# Altium schematic symbol library Sang_library.SchLib: 1607 symbols (part 9 of 15) (continued)
## MC33151
designator U?
High Speed Dual MOSFET Driver; Published: 17-Jul-2002; LatestRevisionDate: 13-Apr-2006; LatestRevisionNote: IPC-7351 Footprint Added.; DatasheetVersion: Apr-2000; PackageVersion: Sep-1999; PackageReference: 751-06; Publisher: Altium Limited; PackageDescription: 8-Pin Small Outline Integrated Circuit 1.27 mm Pitch; Code_JEDEC: MS-012-AA; Code_IPC: SOIC127P600-8; ComponentLink1Description: Manufacturer Link; ComponentLink1URL: http://www.onsemi.com/site/products/parametrics/0,4446,388,00.html; ComponentLink2Description: Datasheet; ComponentLink2URL: http://www.onsemi.com/pub/Collateral/MC34151-D.PDF
footprint DIP8 (DIP, 8-Leads, Row Spacing 7.62mm, Pitch 2.54mm, Body 9.91x6.73mm)
footprint SO8 (SOIC, 8-Leads, Body 4.9x3.9mm, Pitch 1.27mm, IPC High Density)
pins: 1 NC, 2 INA (in), 3 GND (power), 4 INB (in), 5 ~{OUTB} (out), 6 VCC (power), 7 ~{OUTA} (out), 8 NC
text: A; B

## MC33932
designator U?, comment 5A H-Brigde
footprint HSOP44 (HSOP, 44-Leads, Body 16.00x11.00mm, Pitch 0.65mm, IPC High Density)
pins: 1 D1, 2 FBA, 3 EN/~{D2}, 4 V-POW-A, 5 V-POW-A, 6 V-POW-A, 7 OUT1, 8 OUT1, 9 OUT1, 10 V-GND-A, 11 V-GND-A, 12 V-GND-B, 13 V-GND-B, 14 OUT4, 15 OUT4, 16 OUT4, 17 V-PWRB, 18 V-PWRB, 19 CCPB, 20 IN4, 21 IN3, 22 ~{SFB}, 23 D3, 24 FBB, 25 EN/~{D4}, 26 V-PWRB, 27 V-PWRB, 28 V-PWRB, 29 OUT3, 30 OUT3, 31 OUT3, 32 V-GND-B, 33 V-GND-B, 34 V-GND-A, 35 V-GND-A, 36 OUT2, 37 OUT2, 38 OUT2, 39 V-POW-A, 40 V-POW-A, 41 CCPA, 42 IN2, 43 IN1, 44 ~{SFA}

## MC34063AD
designator IC?
DC-to-DC Converter Control Circuit; Published: 15-Apr-2002; LatestRevisionDate: 13-Apr-2006; LatestRevisionNote: IPC-7351 Footprint Added.; DatasheetVersion: 1996; PackageVersion: 1998; PackageReference: 751-05; Publisher: Altium Limited; PackageDescription: 8-Pin Small Outline Integrated Circuit 1.27 mm Pitch; Code_JEDEC: MS-012-AA; Code_IPC: SOIC127P600-8; ComponentLink1Description: Manufacturer Link; ComponentLink1URL: http://www.onsemi.com/site/products/taxonomy/0,4438,503,00.html; ComponentLink2Description: Datasheet; ComponentLink2URL: http://www.onsemi.com/pub/Collateral/MC34063A-D.PDF
footprint SO8
footprint DIP8
pins: 1 SWC, 2 SWE, 3 TCAP, 4 GND (power), 5 IN- (in), 6 VCC (power), 7 IPK, 8 IDC (oc)

## MC145026
designator IC?
Encoder Remote; Value: MC145026
footprint DIP16
pins: 1 A1 (in), 2 A2 (in), 3 A3 (in), 4 A4 (in), 5 A5 (in), 6 A6/D6 (in), 7 A7/D7 (in), 8 GND (power), 9 A8/D8 (in), 10 A9/D9 (in), 11 RS, 12 CTC, 13 RTC, 14 ~{TE} (in), 15 DO (out), 16 VDD (power)

## MC145027
designator IC?, comment MC145017
Decoder Remote; Value: MC145027
footprint DIP16
pins: 1 A1 (in), 2 A2 (in), 3 A3 (in), 4 A4 (in), 5 A5 (in), 6 R1, 7 C1, 8 GND (power), 9 DI (in), 10 R2/C2, 11 VT (out), 12 D9 (out), 13 D8 (out), 14 D7 (out), 15 D6 (out), 16 VDD (power)

## MC 43063
designator MC?, comment MC 34063
Dán; Ghi_Chu: *; Kieu_Chan: *; Don_Vi: *; Ma_Hang: *; Chung_Loai: *; Ten_Linh_Kien: *
footprint SO-8 (8-Pin Small Outline Integrated Circuit 1.27 mm Pitch, IPC Medium Density)
pins: 1 SWC, 2 SWE, 3 TC, 4 GND, 5 CII, 6 VCC, 7 IPK, 8 DRC

## MC 43063_1
designator MC?, comment MC 34063
Dán; Ghi_Chu: *; Kieu_Chan: *; Don_Vi: *; Ma_Hang: *; Chung_Loai: *; Ten_Linh_Kien: *
footprint SO-8 (8-Pin Small Outline Integrated Circuit 1.27 mm Pitch, IPC Medium Density)
pins: 1 SWC, 2 SWE, 3 TC, 4 GND, 5 CII, 6 VCC, 7 IPK, 8 DRC

## MCP42xxx
designator MCP42xxx?
footprint SO14 (SOIC, 14-Leads, Body 8.60x3.90mm, Pitch 1.27mm, IPC Medium Density)
pins: 1 CS, 2 SCK, 3 SI, 4 GND, 5 PB1, 6 PW1, 7 PA1, 8 PA0, 9 PW0, 10 PB0, 11 RS, 12 SHDN, 13 SO, 14 VCC
text: P0; P1

## MCP1541
designator U?
IC VREF SERIES 1% SOT23-3; MPN: MCP1541T-I/TT; MFR: Microchip Technology; Solder: SMT; Value: MCP1541; Category: IC; PinCount: 3
footprint SOT23_3 (SOT23, 3-Leads, Body 2,90x2,30mm, Pitch 0,95mm, IPC Medium Density)
pins: 1 VIN (in), 2 VOUT (out), 3 GND

## MCP1541T
designator P?, comment 4.096V REF
footprint SOT233
pins: 1 IN, 2 OUT, 3 GND

## MCP3201
designator U?
12 BIT A/D CONVERTOR; Manufacturer Part Number: MCP3201-CI/SN; Manufacturer: Microchip Technology; Data Interface: Serial, SPI™; Number of Inputs and Type: 1 Single-Ended, Unipolar; Sampling Rate (Per Second): 100k; Number of Converters: 1; Number of Bits: 12; Voltage Supply Source: Single Supply; Supplier 1: Digi-Key; Supplier Part Number 1: MCP3201-CI/SN-ND; RoHS: RoHS Compliant; Power Dissipation (Max): -; Mounting Type: Surface Mount; Supplier: Digi-Key; Operating Temperature: -40°C ~ 85°C; Category: Integrated Circuits (ICs); Supplier Part Number: MCP3201-CI/SN-ND; Supplier Device Package: *; Packaging: Tube; Package / Case: 8-SOIC (3.9mm Width)
footprint SO8
footprint DIP8
pins: 1 VREF, 2, 3, 4 VSS, 5 ~{CS}, 6 DO, 7 CLK, 8 VCC

## MCP3550
designator U?
22 BIT A/D CONVERTOR; Manufacturer: Microchip Technology; Manufacturer Part Number: MCP3550-60E/SN; Voltage Supply Source: Single Supply; Number of Bits: 22; Sampling Rate (Per Second): 15; Number of Converters: 1; Data Interface: Serial, SPI™; Number of Inputs and Type: 1 Differential, Unipolar; Supplier 1: Digi-Key; Supplier Part Number 1: MCP3550-60E/SN-ND; Power Dissipation (Max): -; Supplier Part Number: MCP3550-60E/SN-ND; Packaging: Tube; Supplier Device Package: *; Supplier: Digi-Key; Operating Temperature: -40°C ~ 125°C; Package / Case: 8-SOIC (3.9mm Width); Mounting Type: Surface Mount; RoHS: RoHS Compliant
footprint SO8
footprint DIP8
pins: 1 VREF, 2, 3, 4 VSS, 5 CLK, 6 DO, 7 ~{CS}, 8 VCC

## MCP4725
designator U?
12 BIT DAC WITH I2C INTERFACE
footprint SOT23-6
footprint DIP6
pins: 1 OUT, 2 GND, 3 VCC, 4 SDA, 5 SCL, 6 A0

## MCR 100-6
designator *
pins: 1 K, 2 A, 3 G

## MCR 100-6_1
designator *
pins: 1 K, 2 A, 3 G

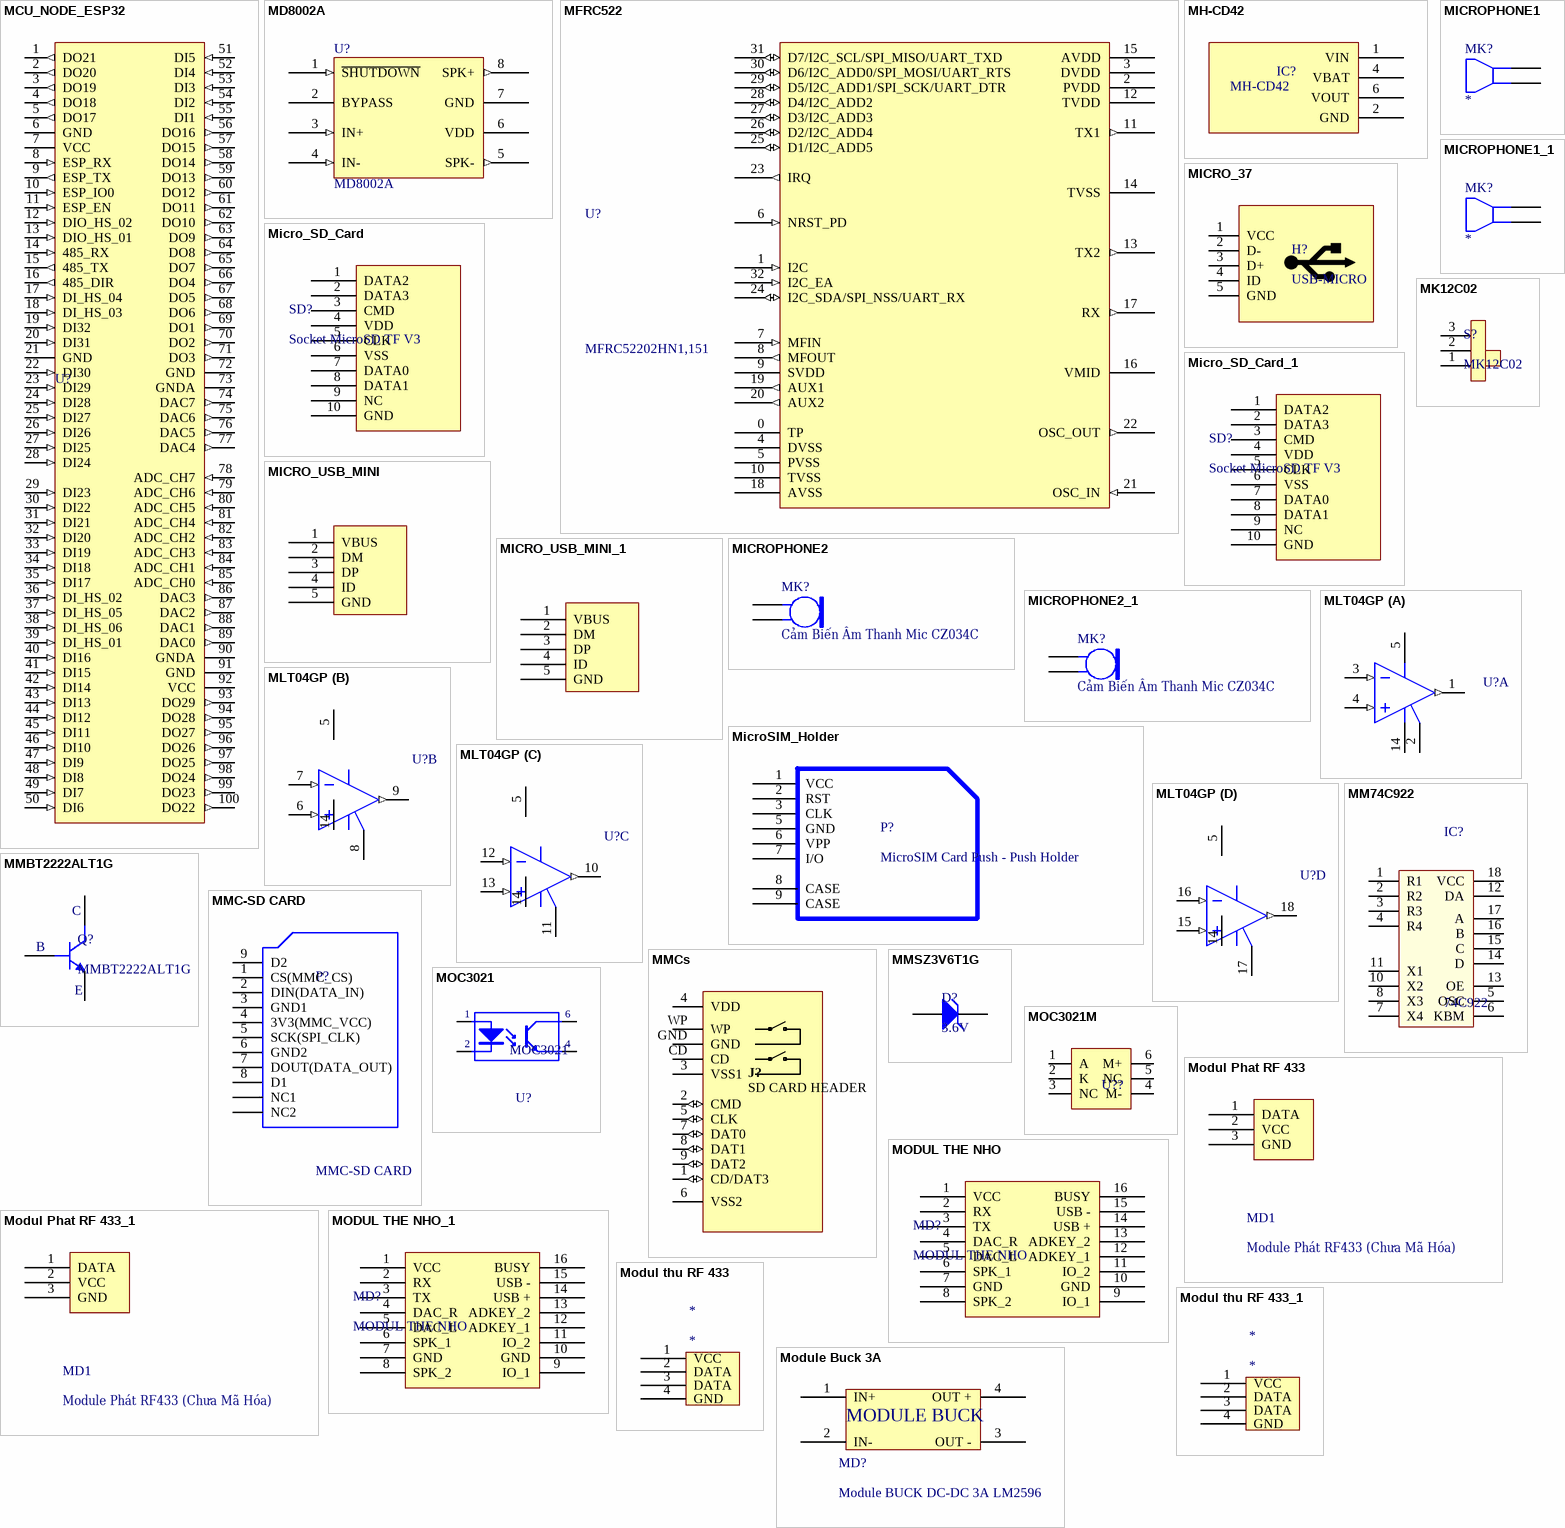
[diagram p55: symbols MCU_NODE_ESP32 to Module Buck 3A]

## MCU_NODE_ESP32
designator U?
MPN: MCU_NODE_ESP32; MFR: BY TECH; Solder: SMT; Category: IC
footprint ESP_NODE_MCU
pins: 1 DO21 (out), 2 DO20 (out), 3 DO19 (out), 4 DO18 (out), 5 DO17 (out), 6 GND, 7 VCC, 8 ESP_RX (in), 9 ESP_TX (out), 10 ESP_IO0 (in), 11 ESP_EN (in), 12 DIO_HS_02 (in), 13 DIO_HS_01 (in), 14 485_RX (in), 15 485_TX (out), 16 485_DIR (out), 17 DI_HS_04 (in), 18 DI_HS_03 (in), 19 DI32 (in), 20 DI31 (in), 21 GND, 22 DI30 (in), 23 DI29 (in), 24 DI28 (in), 25 DI27 (in), 26 DI26 (in), 27 DI25 (in), 28 DI24 (in), 29 DI23 (in), 30 DI22 (in), 31 DI21 (in), 32 DI20 (in), 33 DI19 (in), 34 DI18 (in), 35 DI17 (in), 36 DI_HS_02 (in), 37 DI_HS_05 (in), 38 DI_HS_06 (in), 39 DI_HS_01 (in), 40 DI16 (in), 41 DI15 (in), 42 DI14 (in), 43 DI13 (in), 44 DI12 (in), 45 DI11 (in), 46 DI10 (in), 47 DI9 (in), 48 DI8 (in), 49 DI7 (in), 50 DI6 (in), 51 DI5 (in), 52 DI4 (in), 53 DI3 (in), 54 DI2 (in), 55 DI1 (in), 56 DO16 (out), 57 DO15 (out), 58 DO14 (out), 59 DO13 (out), 60 DO12 (out), 61 DO11 (out), 62 DO10 (out), 63 DO9 (out), 64 DO8 (out), 65 DO7 (out), 66 DO4 (out), 67 DO5 (out), 68 DO6 (out), 69 DO1 (out), 70 DO2 (out), 71 DO3 (out), 72 GND, 73 GNDA, 74 DAC7 (out), 75 DAC6 (out), 76 DAC5 (out), 77 DAC4 (out), 78 ADC_CH7 (in), 79 ADC_CH6 (in), 80 ADC_CH5 (in), 81 ADC_CH4 (in), 82 ADC_CH2 (in), 83 ADC_CH3 (in), 84 ADC_CH1 (in), 85 ADC_CH0 (in), 86 DAC3 (out), 87 DAC2 (out), 88 DAC1 (out), 89 DAC0 (out), 90 GNDA, 91 GND, 92 VCC, 93 DO29 (out), 94 DO28 (out), 95 DO27 (out), 96 DO26 (out), 97 DO25 (out), 98 DO24 (out), 99 DO23 (out), 100 DO22 (out)

## MD8002A
designator U?
3W Audio Amplifier; Solder: SMT; MPN: MD8002A; Value: MD8002A; Category: IC; PinCount: 8
footprint SOIC-8
pins: 1 ~{SHUTDOWN} (in), 2 BYPASS (power), 3 IN+ (in), 4 IN- (in), 5 SPK- (out), 6 VDD (power), 7 GND (power), 8 SPK+ (out)

## MFRC522
designator U?, comment MFRC52202HN1,151
IC RFID READER 13.56MHZ 32HVQFN; MFR: NXP USA Inc.; Solder: SMT; MPN: MFRC52202HN1,151; Value: MFRC52202HN1,151; Category: IC; PinCount: 8
footprint VFQFN-32 (32-VFQFN Exposed Pad)
pins: 0 TP (power), 1 I2C (in), 2 PVDD (power), 3 DVDD (power), 4 DVSS (power), 5 PVSS (power), 6 NRST_PD (in), 7 MFIN (in), 8 MFOUT (out), 9 SVDD (power), 10 TVSS (power), 11 TX1 (out), 12 TVDD (power), 13 TX2 (out), 14 TVSS (power), 15 AVDD (power), 16 VMID (power), 17 RX (out), 18 AVSS (power), 19 AUX1 (out), 20 AUX2 (out), 21 OSC_IN (in), 22 OSC_OUT (out), 23 IRQ (out), 24 I2C_SDA/SPI_NSS/UART_RX (io), 25 D1/I2C_ADD5 (io), 26 D2/I2C_ADD4 (io), 27 D3/I2C_ADD3 (io), 28 D4/I2C_ADD2 (io), 29 D5/I2C_ADD1/SPI_SCK/UART_DTR (io), 30 D6/I2C_ADD0/SPI_MOSI/UART_RTS (io), 31 D7/I2C_SCL/SPI_MISO/UART_TXD (io), 32 I2C_EA (in)

## MH-CD42
designator IC?
footprint MH-CD42
pins: 1 VIN, 2 GND, 4 VBAT, 6 VOUT

## MICRO_37
designator H?, comment USB-MICRO
CONN RECEPT MINI USB R/A 5POS SMD; MPN: MICRO-37; Solder: WAVE; Value: USB-MICRO; MFR_URL: https://item.taobao.com/item.htm?id=575122934297&ali_refid=a3_430008_1006:1159190121:N:micro+usb+%E5%BA%A7:f3882559d872b66fa6d4c50709947fc8&ali_trackid=1_f3882559d872b66fa6d4c50709947fc8&spm=a230r.1.0.0
footprint MICRO-37
pins: 1 VCC, 2 D-, 3 D+, 4 ID, 5 GND

## Micro_SD_Card
designator SD?, comment Socket MicroSD TF V3
Dán; Ten_Linh_Kien: Socket MicroSD TF V3 ( Soket Thẻ Nhớ); Don_Vi: Con; Ma_Hang: MH001914; Ghi_Chu: *; Kieu_Chan: *; Chung_Loai: Dán
footprint MicroSD_TF_V1
footprint MicroSD_TF_V3
pins: 1 DATA2, 2 DATA3, 3 CMD, 4 VDD, 5 CLK, 6 VSS, 7 DATA0, 8 DATA1, 9 NC, 10 GND

## Micro_SD_Card_1
designator SD?, comment Socket MicroSD TF V3
Dán; Ten_Linh_Kien: Socket MicroSD TF V3 ( Soket Thẻ Nhớ); Don_Vi: Con; Ma_Hang: MH001914; Ghi_Chu: *; Kieu_Chan: *; Chung_Loai: Dán
footprint MicroSD_TF_V1
footprint MicroSD_TF_V3
pins: 1 DATA2, 2 DATA3, 3 CMD, 4 VDD, 5 CLK, 6 VSS, 7 DATA0, 8 DATA1, 9 NC, 10 GND

## MICRO_USB_MINI
designator MCR1
footprint Micro USB mini DIP
pins: 1 VBUS, 2 DM, 3 DP, 4 ID, 5 GND

## MICRO_USB_MINI_1
designator MCR1, comment MICRO_USB_MINI
footprint Micro USB mini DIP
pins: 1 VBUS, 2 DM, 3 DP, 4 ID, 5 GND

## MICROPHONE1
designator MK?
Microphone
pins: 1, 2

## MICROPHONE1_1
designator MK?
Microphone
pins: 1, 2

## MICROPHONE2
designator MK?, comment Cảm Biến Âm Thanh Mic CZ034C
Microphone; Ma_Hang: MH004597; Don_Vi: Con; Chung_Loai: Cắm; Kieu_Chan: *; Ten_Linh_Kien: Cảm Biến Âm Thanh Mic CZ034C; Ghi_Chu: *
pins: 1, 2

## MICROPHONE2_1
designator MK?, comment Cảm Biến Âm Thanh Mic CZ034C
Microphone; Ma_Hang: MH004597; Don_Vi: Con; Chung_Loai: Cắm; Kieu_Chan: *; Ten_Linh_Kien: Cảm Biến Âm Thanh Mic CZ034C; Ghi_Chu: *
pins: 1, 2

## MicroSIM_Holder
designator P?, comment MicroSIM Card Push - Push Holder
MFR_URL: Link mua hàng:  http://www.kme.com.vn/khay-micro-sim-y.html; CompanyID: VT-01312; Solder: SMT; Value: MicroSIM Card Push - Push Holder
footprint MicroSIM Card PUSH - PUSH HOLDER
pins: 1 VCC, 2 RST, 3 CLK, 5 GND, 6 VPP, 7 I/O, 8 CASE, 9 CASE

## MK12C02
designator S?
footprint MK12C02
pins: 1 + (power), 2 + (power), 3 + (power)

## MLT04GP
designator U?
Four-Channel, Four-Quadrant Analog Multiplier; Published: 8-Jun-2000; LatestRevisionDate: 04-Mar-2005; LatestRevisionNote: Stylized 3D Model Added.; DatasheetVersion: REV.B 1998; PackageReference: N-18; Publisher: Altium Limited; PackageDescription: DIP; 18 Leads; Row Spacing 7.62 mm; Pitch 2.54 mm; ComponentLink1Description: Manufacturer Link; ComponentLink1URL: http://www.analog.com/en/prod/0%2C2877%2CMLT04%2C00.html; ComponentLink2Description: Datasheet; ComponentLink2URL: http://www.analog.com/UploadedFiles/Data_Sheets/431190299mlt04.pdf
footprint DIP18 (DIP; 18 Leads; Row Spacing 7.62 mm; Pitch 2.54 mm)
pins on every part: 5 +V (power), 14 V- (power)
part A pins: 1 W (out), 2 GND (power), 3 X (in), 4 Y (in)
part B pins: 6 Y (in), 7 X (in), 8 GND (power), 9 W (out)
part C pins: 10 W (out), 11 GND (power), 12 X (in), 13 Y (in)
part D pins: 15 Y (in), 16 X (in), 17 GND (power), 18 W (out)

## MM74C922
designator IC?, comment 74C922
16 Key Encoder With Debouncer; Value: MM74C922
footprint DIP18 (DIP; 18 Leads; Row Spacing 7.62 mm; Pitch 2.54 mm)
pins: 1 R1, 2 R2, 3 R3, 4 R4, 5 OSC, 6 KBM, 7 X4, 8 X3, 9 GND hidden to GND, 10 X2, 11 X1, 12 DA, 13 OE, 14 D, 15 C, 16 B, 17 A, 18 VCC

## MMBT2222ALT1G
designator Q?
TRANS NPN 40V 0.6A SOT23; Solder: SMT; MPN: MMBT2222ALT1G; Value: MMBT2222ALT1G
footprint SOT23_3 (SOT23, 3-Leads, Body 2,90x2,30mm, Pitch 0,95mm, IPC Medium Density)
pins: 1 B, 2 E, 3 C

## MMC-SD CARD
designator P?
Header, 6-Pin; LatestRevisionDate: 17-Jul-2002; LatestRevisionNote: Re-released for DXP Platform.; Publisher: Altium Limited
footprint MMC
pins: 1 CS(MMC_CS), 2 DIN(DATA_IN), 3 GND1, 4 3V3(MMC_VCC), 5 SCK(SPI_CLK), 6 GND2, 7 DOUT(DATA_OUT), 8 D1, 9 D2, NC1, NC2
2 alternate drawings of the same symbol

## MMCs
designator J?, comment SD CARD HEADER
Secure Digital Card Socket; Max Current: mA; Connector type: Header; Mounting Technology: Surface Mount; Status: Production; Category: Connector
footprint mmc1 (SD Card socket)
pins: 1 CD/DAT3 (io), 2 CMD (io), 3 VSS1 (power), 4 VDD (power), 5 CLK (io), 6 VSS2 (power), 7 DAT0 (io), 8 DAT1 (io), 9 DAT2 (io), CD (oc), GND (power), WP (oc)

## MMSZ3V6T1G
designator D?, comment 3.6V
DIODE ZENER 3.6V 500MW SOD123; MPN: MMSZ3V6T1G; MFR: ON; Solder: SMT; Value: 3.6V
footprint SOD-123 (SOD123, 2-Leads, Body 2.6x1.6mm, Pitch 3.05mm, IPC High Density)
pins: 1 A, 2 K

## MOC3021
designator U?
Single Opto; Value: MOC3021
footprint DIP6
footprint SO6
pins: 1 A "Anode", 2 K "Cathode", 4 E "Emitter", 6 C "Collector"

## MOC3021M
designator U??  (value not drawn)
footprint DIP6
footprint SO6
pins: 1 A, 2 K, 3 NC, 4 M-, 5 NC, 6 M+

## Modul Phat RF 433
designator MD1, comment Module Phát RF433 (Chưa Mã Hóa)
Dán; Ma_Hang: MH000581; Don_Vi: Con; Ten_Linh_Kien: Module Phát RF433 (Chưa Mã Hóa); Ghi_Chu: *; Chung_Loai: Dán; Kieu_Chan: *
footprint Modul Phat RF 433
pins: 1 DATA, 2 VCC, 3 GND

## Modul Phat RF 433_1
designator MD1, comment Module Phát RF433 (Chưa Mã Hóa)
Dán; Ma_Hang: MH000581; Don_Vi: Con; Ten_Linh_Kien: Module Phát RF433 (Chưa Mã Hóa); Ghi_Chu: *; Chung_Loai: Dán; Kieu_Chan: *
footprint Modul Phat RF 433
pins: 1 DATA, 2 VCC, 3 GND

## MODUL THE NHO
designator MD?
footprint MODUL MP3
pins: 1 VCC, 2 RX, 3 TX, 4 DAC_R, 5 DAC_L, 6 SPK_1, 7 GND, 8 SPK_2, 9 IO_1, 10 GND, 11 IO_2, 12 ADKEY_1, 13 ADKEY_2, 14 USB +, 15 USB -, 16 BUSY

## MODUL THE NHO_1
designator MD?, comment MODUL THE NHO
footprint MODUL MP3
pins: 1 VCC, 2 RX, 3 TX, 4 DAC_R, 5 DAC_L, 6 SPK_1, 7 GND, 8 SPK_2, 9 IO_1, 10 GND, 11 IO_2, 12 ADKEY_1, 13 ADKEY_2, 14 USB +, 15 USB -, 16 BUSY

## Modul thu RF 433
designator *
pins: 1 VCC , 2 DATA, 3 DATA, 4 GND

## Modul thu RF 433_1
designator *
pins: 1 VCC , 2 DATA, 3 DATA, 4 GND

## Module Buck 3A
designator MD?, comment Module BUCK DC-DC 3A LM2596
Cắm; Ten_Linh_Kien: Module BUCK DC-DC 3A LM2596 ADJ; Don_Vi: Con; Ma_Hang: MH002392; Ghi_Chu: *; Kieu_Chan: *; Chung_Loai: Cắm
footprint Module Buck 3A
pins: 1 IN+, 2 IN-, 3 OUT -, 4 OUT +
text: MODULE BUCK

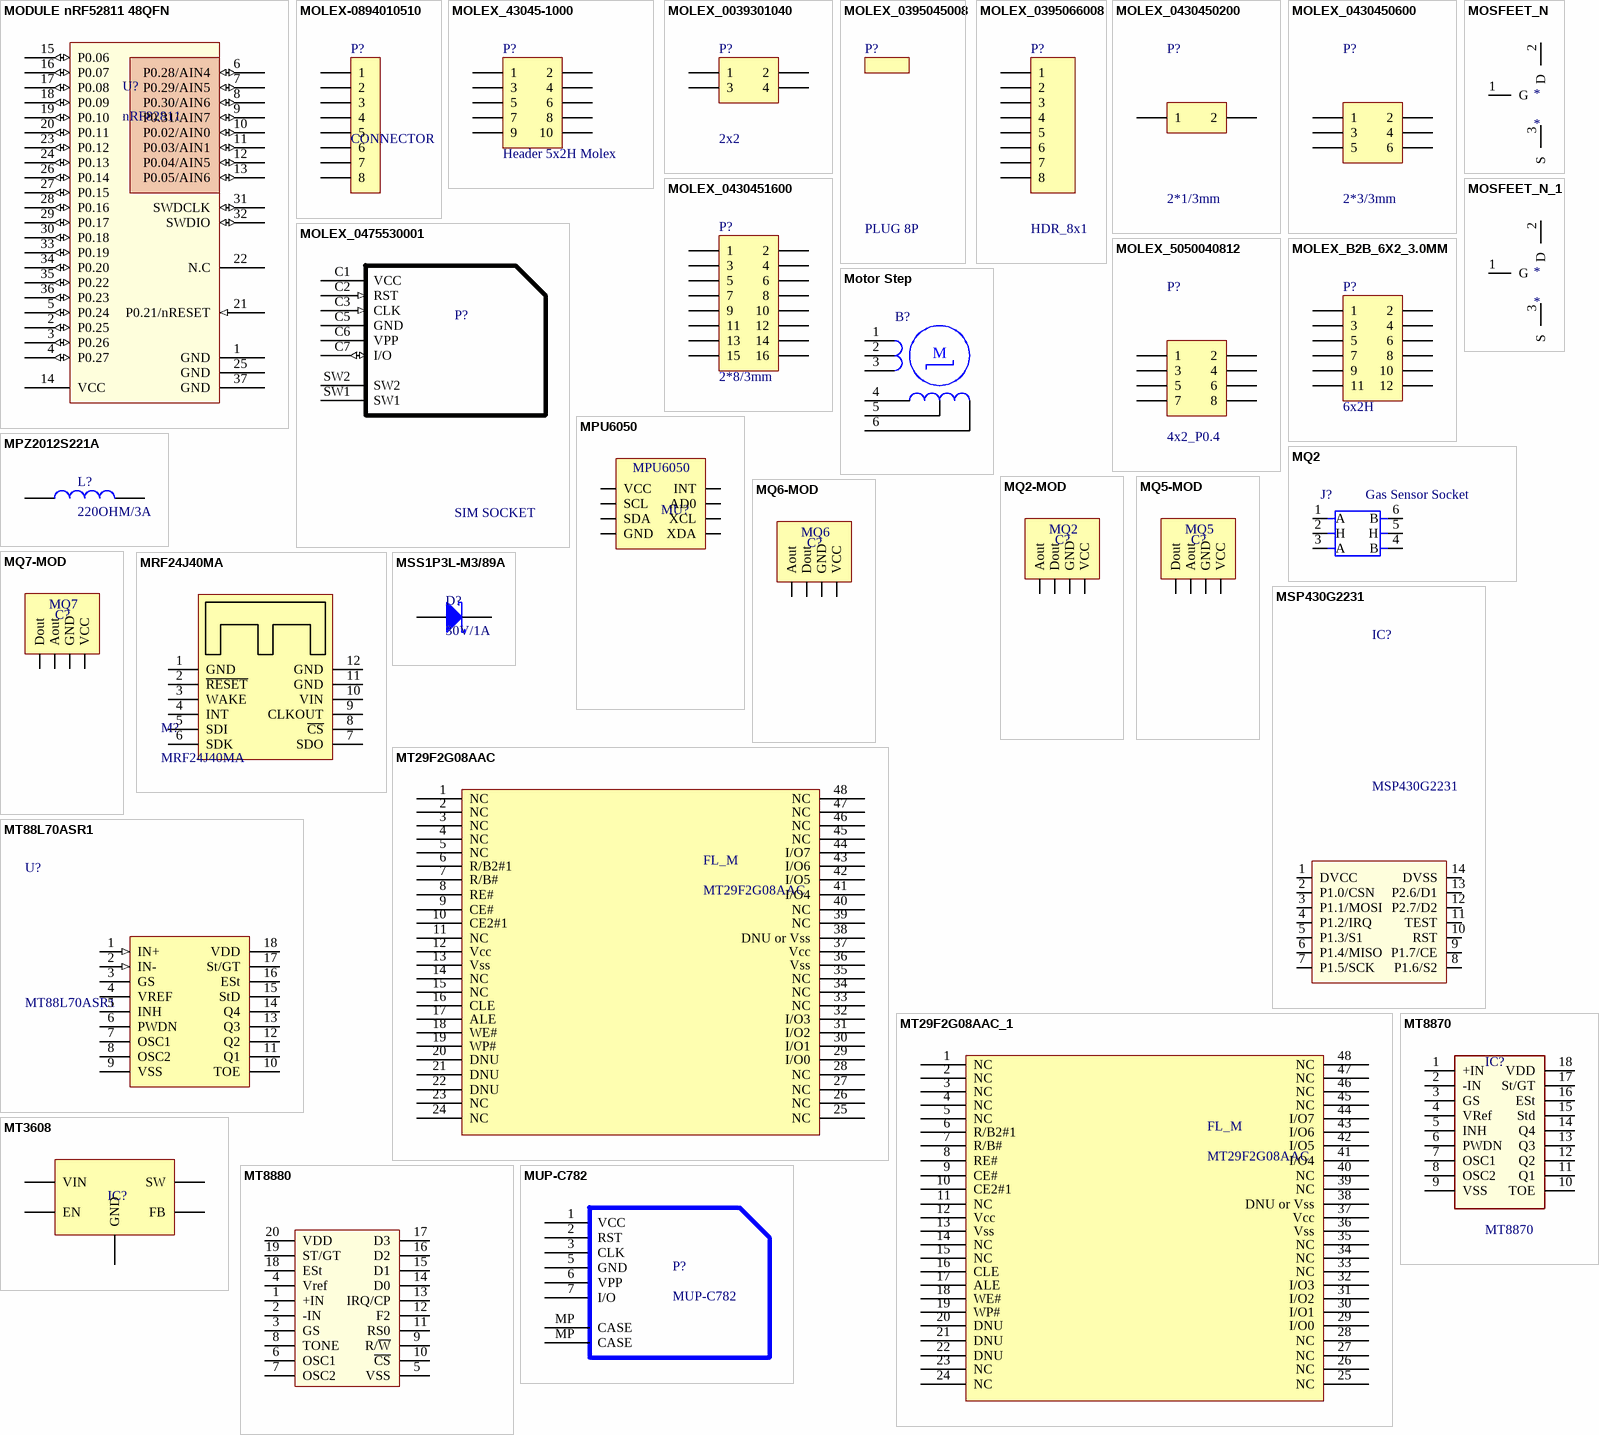
[diagram p56: symbols MODULE nRF52811 48QFN to MUP-C782]

## MODULE nRF52811 48QFN
designator U?, comment nRF82811
MPN: nRF52811 Module; Value: nRF82811
footprint BLE MODULE 52811
pins: 1 GND (power), 2 P0.25 (io), 3 P0.26 (io), 4 P0.27 (io), 5 P0.24 (io), 6 P0.28/AIN4 (io), 7 P0.29/AIN5 (io), 8 P0.30/AIN6 (io), 9 P0.31/AIN7 (io), 10 P0.02/AIN0 (io), 11 P0.03/AIN1 (io), 12 P0.04/AIN5 (io), 13 P0.05/AIN6 (io), 14 VCC (power), 15 P0.06 (io), 16 P0.07 (io), 17 P0.08 (io), 18 P0.09 (io), 19 P0.10 (io), 20 P0.11 (io), 21 P0.21/nRESET (in), 22 N.C, 23 P0.12 (io), 24 P0.13 (io), 25 GND (power), 26 P0.14 (io), 27 P0.15 (io), 28 P0.16 (io), 29 P0.17 (io), 30 P0.18 (io), 31 SWDCLK (io), 32 SWDIO (io), 33 P0.19 (io), 34 P0.20 (io), 35 P0.22 (io), 36 P0.23 (io), 37 GND (power)

## MOLEX-0894010510
designator P?, comment CONNECTOR
CONN HEADER R/A 5POS 2.0MM; MFR: Molex; MPN: 0894010510; Solder: WAVE
footprint MOLEX-0894010810 (Footprint not found)
pins: 1, 2, 3, 4, 5, 6, 7, 8

## MOLEX_43045-1000
designator P?, comment Header 5x2H Molex
Header, 5-Pin, Dual row, Right Angle, Pitch 3mm; MPN: 43045-1000; CompanyID: VT-01112; Solder: WAVE; Value: Header 5x2H Molex; MFR: MOLEX
footprint MOLEX_B2B_5X2_3.0MM
pins: 1, 2, 3, 4, 5, 6, 7, 8, 9, 10

## MOLEX_0039301040
designator P?, comment 2x2
CONN HEADER R/A 4POS 4.2MM; MFR: MOLEX; MPN: 0039301040; Solder: WAVE; Value: 0039301040
signal-integrity model Connector
footprint CON2X2ANGLE
pins: 1, 2, 3, 4

## MOLEX_0395045008
designator P?, comment PLUG 8P  (mechanical)
TERM BLOCK PLUG 8POS STR 3.5MM / (used with 0395066008); MFR: Molex; MPN: 0395045008; Solder: MAN

## MOLEX_0395066008
designator P?, comment HDR_8x1
TERM BLOCK HDR 8POS 90DEG 3.5MM; MFR: Molex; MPN: 0395066008; Solder: WAVE
footprint MOLEX_0395066008 (Footprint not found)
pins: 1, 2, 3, 4, 5, 6, 7, 8

## MOLEX_0430450200
designator P?, comment 2*1/3mm
CONN RECEPT 2POS 3mm DUAL ROW; MPN: 0430450200; Solder: WAVE; Value: 2*1/3mm
footprint HDR_1x2_3.0MM
pins: 1, 2

## MOLEX_0430450600
designator P?, comment 2*3/3mm
CONN RECEPT 6POS 3mm DUAL ROW; MPN: 0430450600; Solder: WAVE; Value: 2*3/3mm
footprint HDR_3x2_3.0MM
pins: 1, 2, 3, 4, 5, 6

## MOLEX_0430451600
designator P?, comment 2*8/3mm
CONN RECEPT 16POS 3mm DUAL ROW; MPN: 0430451600; Solder: WAVE; CompanyID: VT-00132; Value: 2*8/3mm
footprint HDR_8X2_3.0MM
pins: 1, 2, 3, 4, 5, 6, 7, 8, 9, 10, 11, 12, 13, 14, 15, 16

## MOLEX_0475530001
designator P?, comment SIM SOCKET
8 (6 + 2) Position Card CONN SIM/SAM CARD PUSH-PULL R/A; MPN: 0475530001; Solder: SMT; CompanyID: VT-01186; Value: SIM SOCKET
footprint 0475530001 (Footprint not found)
pins: C1 VCC (power), C2 RST (in), C3 CLK (in), C5 GND (power), C6 VPP, C7 I/O (io), SW1, SW2

## MOLEX_5050040812
designator P?, comment 4x2_P0.4
RECP ASSY B-B 0.4 8CKT TP; MPN: 5050040812; Solder: SMT; Value: 4x2_P0.4
footprint 5050040812 (Footprint not found)
pins: 1, 2, 3, 4, 5, 6, 7, 8

## MOLEX_B2B_6X2_3.0MM
designator P?, comment 6x2H
Header, 6-Pin, Dual row, Right Angle, Pitch 3mm; MPN: 43045-1200; CompanyID: VT-01113; Solder: HAND; Value: 6x2H
footprint MOLEX_B2B_6X2_3.0MM
pins: 1, 2, 3, 4, 5, 6, 7, 8, 9, 10, 11, 12

## MOSFEET_N
designator *
pins: 1 G, 2 D, 3 S

## MOSFEET_N_1
designator *
pins: 1 G, 2 D, 3 S

## Motor Step
designator B?
Motor Stepper; Published: 24-Mar-1999; LatestRevisionDate: 17-Jul-2002; LatestRevisionNote: Re-released for DXP Platform.; PackageReference: DIP-6; Publisher: Altium Limited; Code_JEDEC: MO-001-AM
footprint HDR6 (Connector; Header; 6 Position)
pins: 1 1A, 2, 3, 4, 5, 6
text: M

## MPU6050
designator MU?
Manufacturer: W¨¹rth Elektronik eiSos GmbH; partNo: 613004143121; ComponentLink1 Description: Manufacturer; ComponentLink2 Description: Datasheet; NoPins: 04; Created Date: 29 March 2013; ComponentLink1URL: http://www.we-online.com; ComponentLink2URL: http://katalog.we-online.de/em/datasheet/6130xx143121.pdf; Created by: Karrer Zheng
footprint MPU6050
pins: 1 VCC, 2 GND, 3 SCL, 4 SDA, 5 XDA, 6 XCL, 7 AD0, 8 INT

## MPZ2012S221A
designator L?, comment 220OHM/3A
IND-FERRITE BEAD 220 OHM 0805 1LN; MPN: MPZ2012S221A; CompanyID: VT-00253; Solder: SMT; Value: 220OHM/3A; Category: FERRITE BEAD; PinCount: 2
footprint IND-0805 (2012) (Resistor, Chip; 2.00 mm L X 1.25 mm W X 0.70 mm H body)
pins: 1, 2

## MQ2
designator J?, comment Gas Sensor Socket
footprint MQ2 (6P-D17.6X9.8H)
pins: 1 A, 2 H, 3 A, 4 B, 5 H, 6 B

## MQ2-MOD
designator C?
Manufacturer: W¨¹rth Elektronik eiSos GmbH; partNo: 613004143121; ComponentLink1 Description: Manufacturer; ComponentLink2 Description: Datasheet; NoPins: 04; Created Date: 29 March 2013; ComponentLink1URL: http://www.we-online.com; ComponentLink2URL: http://katalog.we-online.de/em/datasheet/6130xx143121.pdf; Created by: Karrer Zheng
footprint MQ2-MODULE
footprint JP4-C1T (4 row, straight, gold plating)
pins: 1 Aout, 2 Dout, 3 GND, 4 VCC
text: MQ2

## MQ5-MOD
designator C?
Manufacturer: W¨¹rth Elektronik eiSos GmbH; partNo: 613004143121; ComponentLink1 Description: Manufacturer; ComponentLink2 Description: Datasheet; NoPins: 04; Created Date: 29 March 2013; ComponentLink1URL: http://www.we-online.com; ComponentLink2URL: http://katalog.we-online.de/em/datasheet/6130xx143121.pdf; Created by: Karrer Zheng
footprint MQ5-MODULE
footprint JP4-C1T (4 row, straight, gold plating)
pins: 1 Dout, 2 Aout, 3 GND, 4 VCC
text: MQ5

## MQ6-MOD
designator C?
Manufacturer: W¨¹rth Elektronik eiSos GmbH; partNo: 613004143121; ComponentLink1 Description: Manufacturer; ComponentLink2 Description: Datasheet; NoPins: 04; Created Date: 29 March 2013; ComponentLink1URL: http://www.we-online.com; ComponentLink2URL: http://katalog.we-online.de/em/datasheet/6130xx143121.pdf; Created by: Karrer Zheng
footprint MQ6-MODULE
footprint JP4-C1T (4 row, straight, gold plating)
pins: 1 Aout, 2 Dout, 3 GND, 4 VCC
text: MQ6

## MQ7-MOD
designator C?
Manufacturer: W¨¹rth Elektronik eiSos GmbH; partNo: 613004143121; ComponentLink1 Description: Manufacturer; ComponentLink2 Description: Datasheet; NoPins: 04; Created Date: 29 March 2013; ComponentLink1URL: http://www.we-online.com; ComponentLink2URL: http://katalog.we-online.de/em/datasheet/6130xx143121.pdf; Created by: Karrer Zheng
footprint MQ6-MODULE
footprint JP4-C1T (4 row, straight, gold plating)
pins: 1 Dout, 2 Aout, 3 GND, 4 VCC
text: MQ7

## MRF24J40MA
designator M?
Microchip Zigbee Module
footprint MRF24J40MA (Microchip Zigbee Module)
pins: 1 GND, 2 ~{RESET}, 3 WAKE, 4 INT, 5 SDI, 6 SDK, 7 SDO, 8 ~{CS}, 9 CLKOUT, 10 VIN, 11 GND, 12 GND

## MSP430G2231
designator IC?
Value: 16F88; Value: DIP18
footprint DIP14
footprint TSSOP14 (TSSOP, 14-Leads, Body 5.00x4.40mm, Pitch 0.65mm, IPC High Density)
pins: 1 DVCC, 2 P1.0/CSN, 3 P1.1/MOSI, 4 P1.2/IRQ, 5 P1.3/S1, 6 P1.4/MISO, 7 P1.5/SCK, 8 P1.6/S2, 9 P1.7/CE, 10 RST, 11 TEST, 12 P2.7/D2, 13 P2.6/D1, 14 DVSS

## MSS1P3L-M3/89A
designator D?, comment 30V/1A
DIODE SCHOTTKY 30V 1A MICROSMP; MPN: MSS1P3L-M3/89A; Solder: SMT; CompanyID: VT-01279; Value: 30V/1A
pins: 1 A, 2 K

## MT29F2G08AAC
designator FL_M
pins: 1 NC, 2 NC, 3 NC, 4 NC, 5 NC, 6 R/B2#1, 7 R/B#, 8 RE#, 9 CE#, 10 CE2#1, 11 NC, 12 Vcc, 13 Vss, 14 NC, 15 NC, 16 CLE, 17 ALE, 18 WE#, 19 WP#, 20 DNU, 21 DNU, 22 DNU, 23 NC, 24 NC, 25 NC, 26 NC, 27 NC, 28 NC, 29 I/O0, 30 I/O1, 31 I/O2, 32 I/O3, 33 NC, 34 NC, 35 NC, 36 Vss, 37 Vcc, 38 DNU or Vss, 39 NC, 40 NC, 41 I/O4, 42 I/O5, 43 I/O6, 44 I/O7, 45 NC, 46 NC, 47 NC, 48 NC

## MT29F2G08AAC_1
designator FL_M, comment MT29F2G08AAC
pins: 1 NC, 2 NC, 3 NC, 4 NC, 5 NC, 6 R/B2#1, 7 R/B#, 8 RE#, 9 CE#, 10 CE2#1, 11 NC, 12 Vcc, 13 Vss, 14 NC, 15 NC, 16 CLE, 17 ALE, 18 WE#, 19 WP#, 20 DNU, 21 DNU, 22 DNU, 23 NC, 24 NC, 25 NC, 26 NC, 27 NC, 28 NC, 29 I/O0, 30 I/O1, 31 I/O2, 32 I/O3, 33 NC, 34 NC, 35 NC, 36 Vss, 37 Vcc, 38 DNU or Vss, 39 NC, 40 NC, 41 I/O4, 42 I/O5, 43 I/O6, 44 I/O7, 45 NC, 46 NC, 47 NC, 48 NC

## MT88L70ASR1
designator U?
IC TELECOM INTERFACE 18SOIC; MFR: Microchip Technology; Solder: SMT; MPN: MT88L70ASR1; Value: MT88L70ASR1; Category: IC; PinCount: 18
footprint SOIC-18 (SOIC, 18-Leads, Body 11.5x7.5mm, Pitch 1.27mm, IPC Low Density)
pins: 1 IN+ (in), 2 IN- (in), 3 GS, 4 VREF, 5 INH, 6 PWDN, 7 OSC1, 8 OSC2, 9 VSS, 10 TOE, 11 Q1, 12 Q2, 13 Q3, 14 Q4, 15 StD, 16 ESt, 17 St/GT, 18 VDD

## MT3608
designator IC?  (value not drawn)
footprint SOT23-6
pins: 1  SW, 2 GND, 3 FB, 4 EN, 5 VIN

## MT8870
designator IC?
DTMF RECEIVER IC MT8870 TESTER; Value: MT8068
footprint DIP18 (DIP; 18 Leads; Row Spacing 7.62 mm; Pitch 2.54 mm)
footprint SO18 (SOIC, 18-Leads, Body 11.6x7.5mm, Pitch 1.27mm, IPC High Density)
pins: 1 +IN, 2 -IN, 3 GS, 4 VRef, 5 INH, 6 PWDN, 7 OSC1, 8 OSC2, 9 VSS, 10 TOE, 11 Q1, 12 Q2, 13 Q3, 14 Q4, 15 Std, 16 ESt, 17 St/GT, 18 VDD

## MT8880
designator IC?, comment MT8880C
Integrated DTMF Transceiver; Value: DIP20; Value: MT8880C
footprint DIP20 (DIP 20, 20 PIN, W 300mil, Pin to pin 100mil)
footprint SO20 (SOIC, 20-Leads, Body 12.60x7.50mm, Pitch 1.27mm, IPC Medium Density)
pins: 1 +IN, 2 -IN, 3 GS, 4 Vref, 5 VSS, 6 OSC1, 7 OSC2, 8 TONE, 9 R/~{W}, 10 ~{CS}, 11 RS0, 12 F2, 13 IRQ/CP, 14 D0, 15 D1, 16 D2, 17 D3, 18 ESt, 19 ST/GT, 20 VDD

## MUP-C782
designator P?
MicroSIM Card Push - Push Holder; MFR: MUP; MPN: C782; Solder: SMT; Value: MUP-C782
footprint MUP-C782
pins: 1 VCC, 2 RST, 3 CLK, 5 GND, 6 VPP, 7 I/O, MP CASE, MP CASE

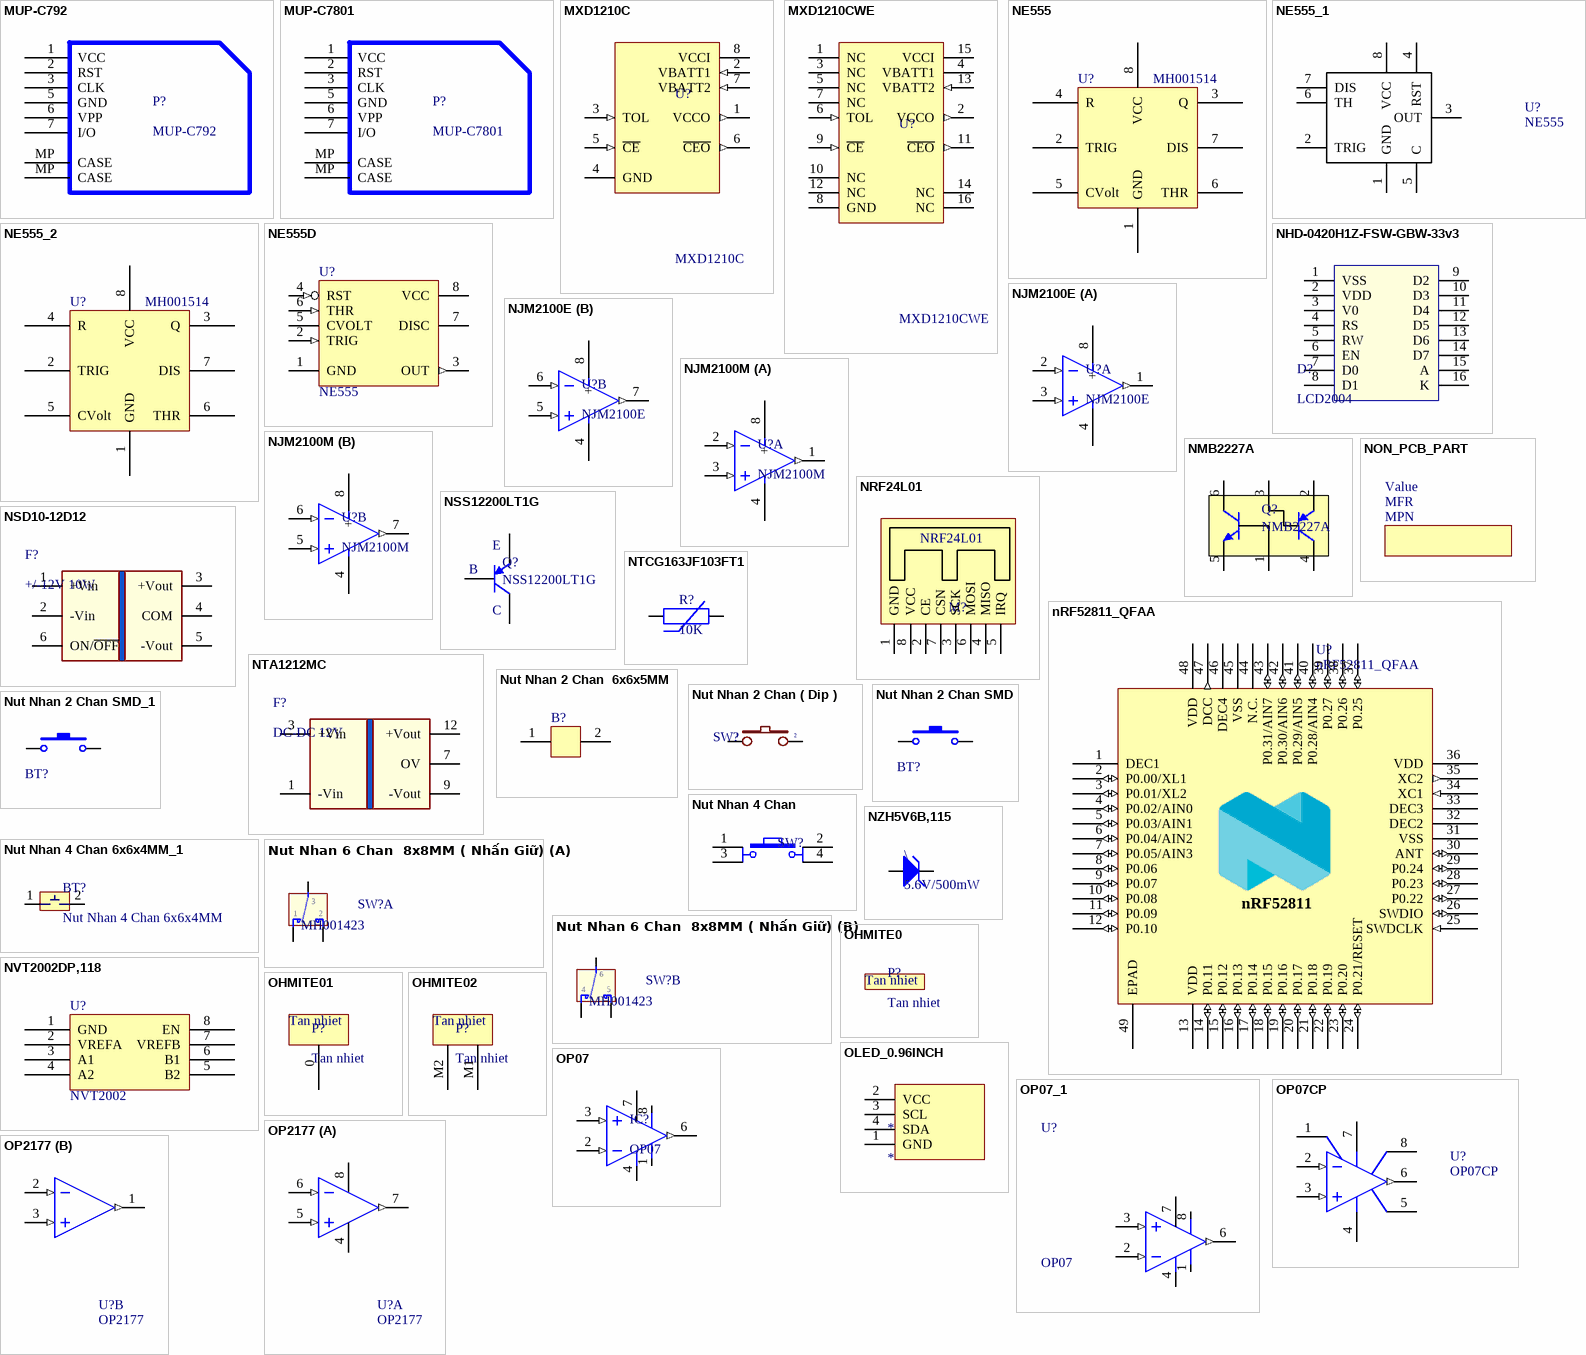
[diagram p57: symbols MUP-C792 to OP2177]

## MUP-C792
designator P?
MicroSIM Card Push - Push Holder; MFR: MUP; MPN: C792; Solder: SMT; Value: MUP-C792
footprint MUP-C792 (MicroSIM Card PUSH - PUSH HOLDER)
pins: 1 VCC, 2 RST, 3 CLK, 5 GND, 6 VPP, 7 I/O, MP CASE, MP CASE

## MUP-C7801
designator P?
NanoSIM Card Push - Push Holder; MFR: MUP; MPN: C7801; Solder: SMT; Value: MUP-C7801
footprint MUP-C7801
pins: 1 VCC, 2 RST, 3 CLK, 5 GND, 6 VPP, 7 I/O, MP CASE, MP CASE

## MXD1210C
designator U?
Nonvolatile RAM Controller; Published: 16-Jan-2001; LatestRevisionDate: 29-May-2009; LatestRevisionNote: Component Body Added.; DatasheetVersion: Mar-1996; PackageVersion: RevB, 21-0043; PackageReference: PA8; Publisher: Altium Limited; PackageDescription: DIP, 8-Pin, Row Spacing 7.62 mm, Pitch 2.54 mm; Code_JEDEC: MS-001-AB; ComponentLink1Description: Manufacturer Link; ComponentLink1URL: http://www.maxim-ic.com/; ComponentLink2Description: Datasheet; ComponentLink2URL: http://pdfserv.maxim-ic.com/en/ds/MXD1210.pdf
footprint DIP8
footprint SO8 (SOIC, 8-Leads, Body 4.9x3.9mm, Pitch 1.27mm, IPC High Density)
pins: 1 VCCO (out), 2 VBATT1 (in), 3 TOL (in), 4 GND (power), 5 ~{CE} (in), 6 ~{CEO} (out), 7 VBATT2 (in), 8 VCCI (power)

## MXD1210CWE
designator U?
Nonvolatile RAM Controller; Published: 16-Jan-2001; LatestRevisionDate: 13-Apr-2006; LatestRevisionNote: IPC-7351 Footprint Added.; DatasheetVersion: Mar-1996; PackageReference: WSO16; Publisher: Altium Limited; PackageDescription: 16-Pin Small Outline Integrated Circuit 1.27 mm Pitch; Code_JEDEC: MS-013-AA; Code_IPC: SOIC127P1030-16; ComponentLink1Description: Manufacturer Link; ComponentLink1URL: http://www.maxim-ic.com/; ComponentLink2Description: Datasheet; ComponentLink2URL: http://pdfserv.maxim-ic.com/en/ds/MXD1210.pdf
footprint SO16L (SOIC, 16-Leads, Body 10.30x7.50mm, Pitch 1.27mm, IPC Medium Density)
pins: 1 NC, 2 VCCO (out), 3 NC, 4 VBATT1 (power), 5 NC, 6 TOL (in), 7 NC, 8 GND (power), 9 ~{CE} (in), 10 NC, 11 ~{CEO} (out), 12 NC, 13 VBATT2 (in), 14 NC, 15 VCCI (power), 16 NC

## NE555
designator U?, comment MH001514
Dán; Value: NE555 SOP8
footprint sop 8
pins: 1 GND, 2 TRIG, 3 Q, 4 R, 5 CVolt, 6 THR, 7 DIS, 8 VCC

## NE555_1
designator U?, comment NE555
TIMER IC; Manufacturer Part Number: NE555DT; Manufacturer: STMicroelectronics; Frequency: 500kHz; Voltage - Supply: 4.5 V ~ 16 V; Current: 200mA; Supplier 1: Digi-Key; Supplier Part Number 1: 497-1962-2-ND; Supplier: Digi-Key; Category: Integrated Circuits (ICs); Supplier Part Number: 497-1962-2-ND; Package / Case: 8-SOIC (3.9mm Width); Packaging: Tape & Reel (TR); RoHS: RoHS Compliant; Operating Temperature: 0°C ~ 70°C; Count: -; Type: 555 Type, Timer/Oscillator (Single)
footprint SO8
footprint DIP8
pins: 1 GND, 2 TRIG, 3 OUT, 4 RST, 5 C, 6 TH, 7 DIS, 8 VCC

## NE555_2
designator U?, comment MH001514
Dán; Value: NE555 SOP8
footprint sop 8
pins: 1 GND, 2 TRIG, 3 Q, 4 R, 5 CVolt, 6 THR, 7 DIS, 8 VCC

## NE555D
designator U?, comment NE555
General-Purpose Single Bipolar Timer; MPN: LM555CMX/NOPB; Solder: SMT; Value: NE555; Category: IC
footprint SOIC8 (OPA2333)
pins: 1 GND (power), 2 TRIG (in), 3 OUT (out), 4 RST (in), 5 CVOLT, 6 THR (in), 7 DISC (oc), 8 VCC (power)

## NHD-0420H1Z-FSW-GBW-33v3
designator D?, comment LCD2004
footprint NHD-0420H1Z-FSW-GBW-33v3
pins: 1 VSS, 2 VDD, 3 V0, 4 RS, 5 RW, 6 EN, 7 D0, 8 D1, 9 D2, 10 D3, 11 D4, 12 D5, 13 D6, 14 D7, 15 A, 16 K

## NJM2100E
designator U?
DUAL OPERATIONAL AMPLIFIER; MFR: New Japan Radio; Solder: SMT; MPN: NJM2100E; Category: IC; Value: NJM2100E
footprint SOIC-8
part A pins: 1 OUT (out), 2 IN- (in), 3 IN+ (in), 4 VEE (power), 8 + (power)
part B pins: 4 VEE (power), 5 IN+ (in), 6 IN- (in), 7 OUT (out), 8 + (power)

## NJM2100M
designator U?
DUAL OPERATIONAL AMPLIFIER; MFR: New Japan Radio; Solder: SMT; MPN: NJM2100M; Category: IC; Value: NJM2100M
footprint DMP8 (TSOP, 8-Leads, Body 5.00x5.00mm, Pitch 1.27mm, IPC Medium Density)
part A pins: 1 OUT (out), 2 IN- (in), 3 IN+ (in), 4 VEE (power), 8 + (power)
part B pins: 4 VEE (power), 5 IN+ (in), 6 IN- (in), 7 OUT (out), 8 + (power)

## NMB2227A
designator Q?
TRANS PREBIAS NPN 250MW TO236AB; MFR: NXP Semiconductors; Solder: SMT; Value: NMB2227A; MPN: NMB2227A
pins: 1 B1, 2 E2, 3 B2, 4 C2, 5 E1, 6 C1

## NON_PCB_PART
designator M?, comment Value
Solder: *; Category: Misc; Value: Value; MPN: MPN; MFR: MFR

## NRF24L01
designator M?
footprint NRF24L01
footprint JP4-C2T (8 pins, dual row, straight, gold plating)
pins: 1 GND, 2 CE, 3 SCK, 4 MISO, 5 IRQ, 6 MOSI, 7 CSN, 8 VCC

## nRF52811_QFAA
designator U?
Multi-protocol Bluetooth Low Energy, ANT and 2.4GHz proprietary system-on-chip; MFR: Nordic Semiconductor; MPN: nRF52811_QFAA
footprint 48-VFQFN (VFQFN, 48-lead, Body 6x6 mm, 0.5 mm pitch,IPC High Density)
pins: 1 DEC1 (power), 2 P0.00/XL1 (io), 3 P0.01/XL2 (io), 4 P0.02/AIN0 (io), 5 P0.03/AIN1 (io), 6 P0.04/AIN2 (io), 7 P0.05/AIN3 (io), 8 P0.06 (io), 9 P0.07 (io), 10 P0.08 (io), 11 P0.09 (io), 12 P0.10 (io), 13 VDD (power), 14 P0.11 (io), 15 P0.12 (io), 16 P0.13 (io), 17 P0.14 (io), 18 P0.15 (io), 19 P0.16 (io), 20 P0.17 (io), 21 P0.18 (io), 22 P0.19 (io), 23 P0.20 (io), 24 P0.21/RESET (io), 25 SWDCLK (in), 26 SWDIO (io), 27 P0.22 (io), 28 P0.23 (io), 29 P0.24 (io), 30 ANT (io), 31 VSS (power), 32 DEC2 (power), 33 DEC3 (power), 34 XC1 (in), 35 XC2 (out), 36 VDD (power), 37 P0.25 (io), 38 P0.26 (io), 39 P0.27 (io), 40 P0.28/AIN4 (io), 41 P0.29/AIN5 (io), 42 P0.30/AIN6 (io), 43 P0.31/AIN7 (io), 44 N.C. (power), 45 VSS (power), 46 DEC4 (power), 47 DCC (out), 48 VDD (power), 49 (power) hidden to GND, 49 EPAD (power)
text: nRF52811

## NSD10-12D12
designator F?, comment +/-12V 10W
DC DC CONVERTER +/-12V 10W; MPN: NSD10-12D12; Solder: WAVE; Value: +/-12V 10W
footprint MW-NSD10
pins: 1 +Vin, 2 -Vin, 3 +Vout, 4 COM, 5 -Vout, 6 ON/~{OFF}

## NSS12200LT1G
designator Q?
TRANS BIPOLAR PNP 12V 2A SOT-23; Solder: SMT; CompanyID: VT-00380; MPN: NSS12200LT1G; Value: NSS12200LT1G
footprint SOT23_3 (SOT23, 3-Leads, Body 2,90x2,30mm, Pitch 0,95mm, IPC Medium Density)
pins: 1 B, 2 E, 3 C

## NTA1212MC
designator F?, comment DC-DC 12V
DC DC CONVERTER +/-12V 1W; MPN: NTA1212MC; Solder: SMT; Value: DC-DC 12V
footprint NTA1212MC
pins: 1 -Vin, 3 +Vin, 7 OV, 9 -Vout, 12 +Vout

## NTCG163JF103FT1
designator R?, comment 10K
THERMISTOR 10K OHM 1% 0603; MPN: NTCG163JF103FT1; CompanyID: VT-01145; Solder: SMT; Value: 10K; Category: RESISTOR
footprint RESC-0603 (1608) (Resistor, Chip; 1.60 mm L X 0.80 mm W X 0.50 mm H body)
pins: 1, 2

## Nut Nhan 2 Chan  6x6x5MM
designator B?
Cắm; Ten_Linh_Kien: Nút Nhấn 2 Chân 6x6x5MM DIP; Don_Vi: Con; Ma_Hang: MH001959; Ghi_Chu: *; Kieu_Chan: *; Chung_Loai: Cắm
footprint Button 2 Pin (Button 200mil 2 Pin)
footprint BUTTON SMD 2
pins: 1, 2

## Nut Nhan 2 Chan ( Dip )
designator SW?
Cắm; Ten_Linh_Kien: Nút Nhấn 2 Chân 6x6x5MM DIP; Ma_Hang: MH001959; Don_Vi: Con; Kieu_Chan: *; Ghi_Chu: *; Chung_Loai: Cắm
footprint SW2 (SW button 2pin, 250x 250 mil)
footprint SW-2P-S
pins: 1, 2

## Nut Nhan 2 Chan SMD
designator BT?, comment Nút Nhấn 2 Chân 3x6x2.5MM SMD  (value not drawn)
Dán; Don_Vi: Con; Ma_Hang: MH001036; Ghi_Chu: *; Kieu_Chan: *; Ten_Linh_Kien: Nút Nhấn 2 Chân 3x6x2.5MM SMD; Chung_Loai: Dán
footprint Nut Nhan 2 Chan SMD_N (Switch SMD type)
pins: 1, 2

## Nut Nhan 2 Chan SMD_1
designator BT?, comment Nút Nhấn 2 Chân 3x6x2.5MM SMD  (value not drawn)
Dán; Don_Vi: Con; Ma_Hang: MH001036; Ghi_Chu: *; Kieu_Chan: *; Ten_Linh_Kien: Nút Nhấn 2 Chân 3x6x2.5MM SMD; Chung_Loai: Dán
footprint Nut Nhan 2 Chan SMD_N (Switch SMD type)
pins: 1, 2

## Nut Nhan 4 Chan
designator SW?
Cắm; Value: Nút Nhấn 4 Chân 6x6x9MM DIP; Ma_Hang: MH004077; Don_Vi: Con; Kieu Chan: *; Ghi Chu: *
footprint SW4 (SW button 4pin, 250 x250 mil)
footprint SW4B (SW button 4pin, 450 x 450 mil)
footprint SW-4P-S
pins: 1, 2, 3, 4